# Altium footprint library 二极管封装库.PcbLib: 222 footprints (part 5 of 14)
Each footprint in its own frame and in the unit in brackets; x right, y up, seen from the top. Pads: shape width x height; smd on the part's side, far side on the other; paste and mask are expansions set on the pad; w line width, h text height; cw(c..) or ccw(c..) is an arc to the next point about the centre after c.
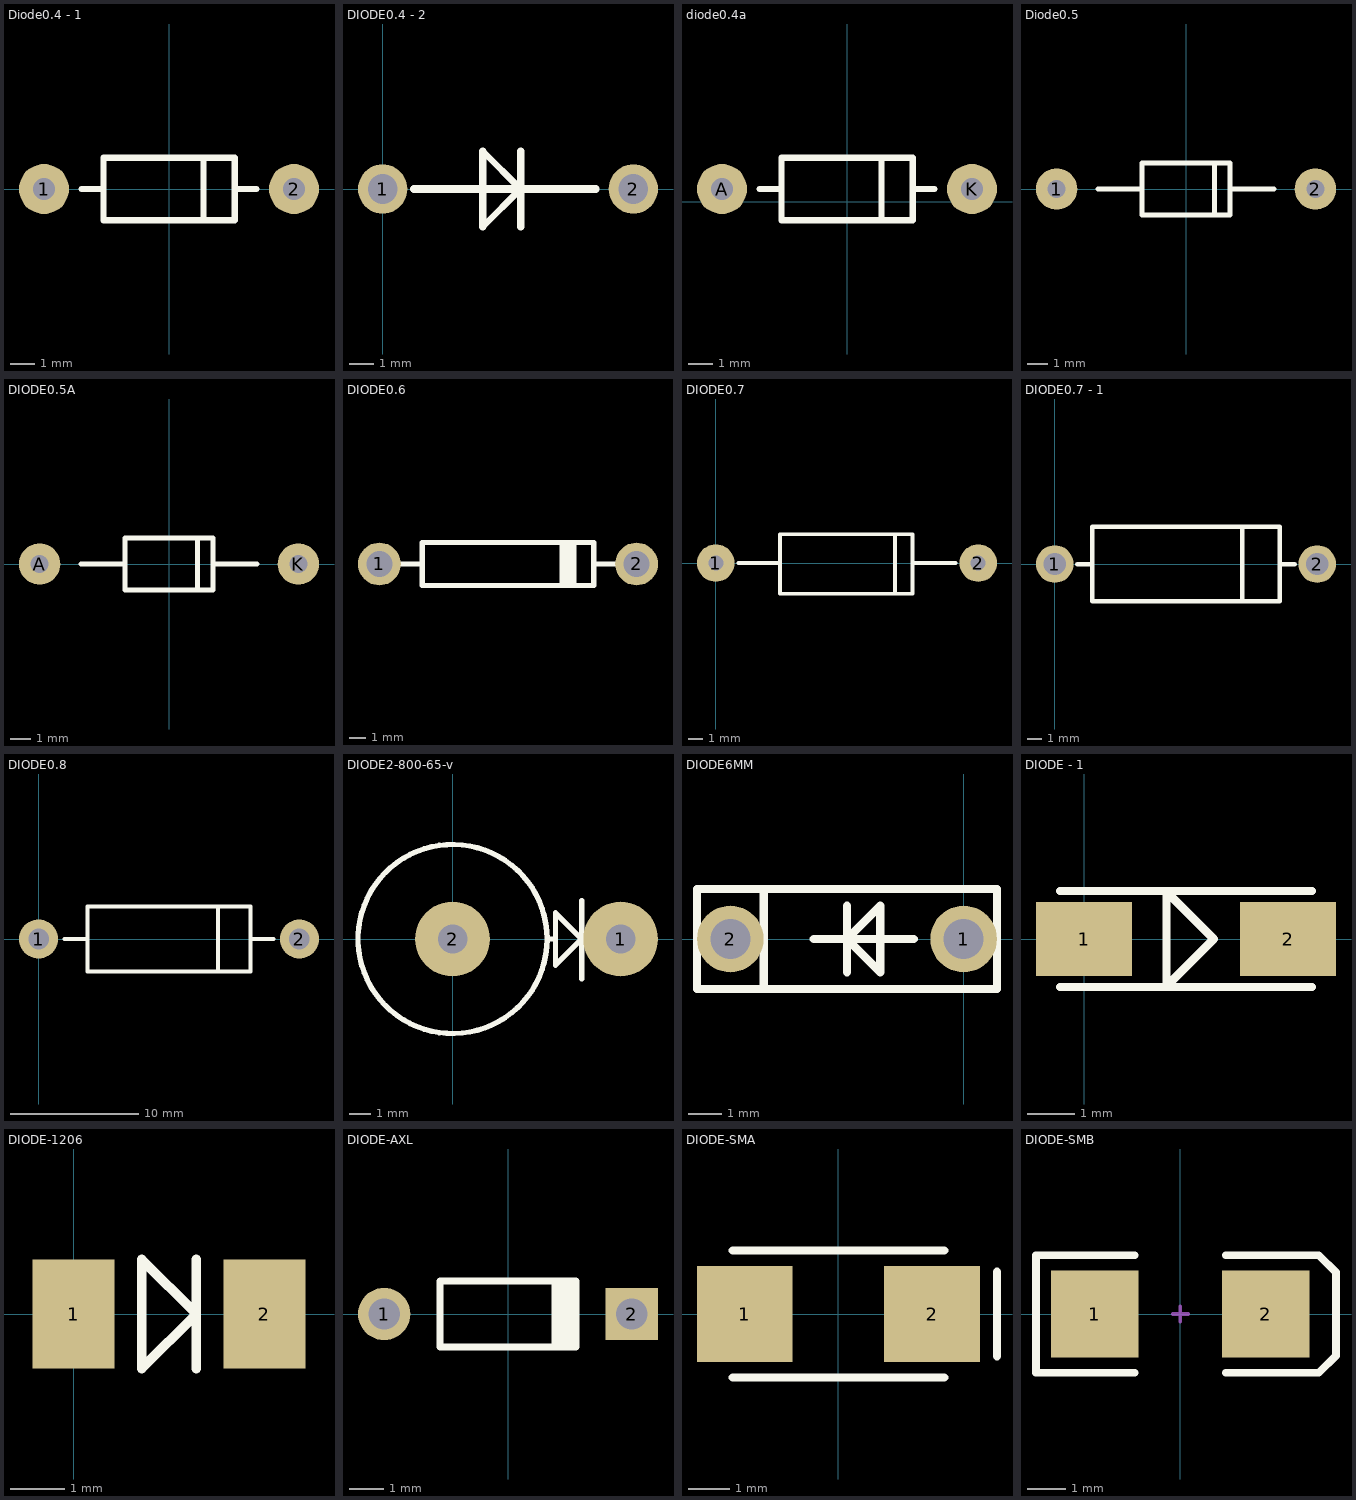
[diagram p4: the footprints below, top view; thin cyan lines are the x and y axes]

## Diode0.4 - 1 [mil]
pads (2):
  round 80 hole 35: 1(-200,0) 2(200,0)
Top Overlay:
  lines w10: -140,0 -105,0 ; 55,-50 55,50 ; 105,0 140,0 ; -105,-50 105,-50 105,50 -105,50 -105,-10 -105,-50

## DIODE0.4 - 2 [mm]
pads (2):
  round 2 hole 1.2: 1(0,0) 2(10.16,0)
Top Overlay:
  lines w0.254: 4.064,-1.524 5.588,0 4.064,1.524
  lines w0.305: 1.27,0 8.636,0 ; 4.064,-1.524 4.064,1.524 ; 5.588,-1.524 5.588,1.524

## diode0.4a [mil]
pads (2):
  round 80 hole 35: A(-200,20) K(200,20)
Top Overlay:
  lines w10: -140,20 -105,20 ; 55,-30 55,70 ; 105,20 140,20 ; -105,-30 105,-30 105,70 -105,70 -105,10 -105,-30

## Diode0.5 [mil]
pads (2):
  round 80 hole 35: 1(-250,0) 2(250,0)
Top Overlay:
  lines w10: -170,0 -85,0 ; 55,-50 55,50 ; 85,0 170,0 ; -85,0 -85,-50 85,-50 85,50 -85,50 -85,0

## DIODE0.5A [mil]
pads (2):
  round 80 hole 35: A(-250,0) K(250,0)
Top Overlay:
  lines w10: -170,0 -85,0 ; 55,-50 55,50 ; 85,0 170,0 ; -85,0 -85,50 85,50 85,-50 -85,-50 -85,0

## DIODE0.6 [mil]
pads (2):
  round 100 hole 60: 1(11000,-2000) 2(11600,-2000)
Top Overlay:
  rectangle: 11420,-2050 11460,-1950
  lines w12: 11040,-2000 11100,-2000 ; 11500,-2000 11560,-2000 ; 11100,-2050 11100,-1950 11500,-1950 11500,-2050 11100,-2050

## DIODE0.7 [mil]
pads (2):
  round 100 hole 40: 1(0,0) 2(700,0)
Top Overlay:
  lines w10: 60,0 170,0 ; 478,-82 478,77 ; 528,0 640,0 ; 171,-82 525,-82 525,77 171,77 171,-82
3D body "User Library-1N5353B.step": height 151.18, standoff -118.11, extent -17.85,-74.88 721.85,70

## DIODE0.7 - 1 [mm]
pads (2):
  round 2.54 hole 1.5: 1(0,0) 2(17.78,0)
Top Overlay:
  lines w0.305: 1.524,0 2.54,0 ; 12.7,-2.54 12.7,2.54 ; 15.24,0 16.256,0 ; 2.54,-2.54 15.24,-2.54 15.24,2.54 2.54,2.54 2.54,-2.54

## DIODE0.8 [mil]
pads (2):
  round 120 hole 62.99: 1(0,0) 2(800,0)
Top Overlay:
  lines w12: 80,0 150,0 ; 550,-100 550,100 ; 650,0 720,0 ; 150,-100 650,-100 650,100 150,100 150,-100

## DIODE2-800-65-v [mil]
pads (2):
  round 140 hole 55.12: 1(314.96,0) 2(0,0)
Top Overlay:
  circle w10: c0,0 r177.17
  lines w10: 177.17,0 193,0 ; 242,-75 242,72 ; 193,-49 242,0 193,49 193,-49

## DIODE6MM [mm]
pads (2):
  round 2 hole 1.2: 1(0,0) 2(-7,0)
Top Overlay:
  lines w0.254: -6,-1.5 -6,1.5 ; -4.5,0 -1.5,0 ; -3.5,-1 -3.5,1 ; -8,-1.5 -8,1.5 1,1.5 1,-1.5 -8,-1.5 ; -3.5,0 -2.5,-1 -2.5,1 -3.5,0

## DIODE - 1 [mil]
pads (2):
  rect 80x62 smd: 1(0,0) 2(170,0)
Top Overlay:
  lines w7: -20,-40 190,-40 ; -20,40 190,40 ; 68.74,-39.37 108.11,0 68.74,39.37 68.74,-39.37

## DIODE-1206 [mm] "玻璃封装二极管"
height 3
pads (2):
  rect 1.5x2 smd: 1(0,0) 2(3.5,0)
Top Overlay:
  lines w0.178: 2.25,-1 2.25,1 ; 1.25,-1 2.25,0 1.25,1 1.25,-1

## DIODE-AXL [mm] "直插二极管"
height 1.9
pads (2):
  round 1.5 hole 0.9: 1(-3.55,0)
  rect 1.5x1.5 hole 0.9: 2(3.55,0)
Top Overlay:
  rectangle: 1.25,-0.95 2.05,0.95
  lines w0.2: 1.95,-0.95 -1.95,-0.95 -1.95,0.95 1.95,0.95

## DIODE-SMA [mm] "贴片二极管"
height 2.54
pads (2):
  rect 2.3x2.3 smd: 1(-2.25,0) 2(2.25,0)
Top Overlay:
  lines w0.2: -2.54,-1.524 2.54,-1.524 ; -2.54,1.524 2.54,1.524 ; 3.81,-1.016 3.81,1.016
3D body: height 3, standoff 0, extent -2.921,-1.397 2.921,1.397

## DIODE-SMB [mm] "DO-214-AA/SMB; 2 C-Bend Leads; Body 5.3 x 3.6 mm, inc. leads (LxW)"
height 2.54
pads (2):
  rect 2.3x2.3 smd: 1(-2.25,0) 2(2.25,0)
Top Overlay:
  lines w0.2: -1.2,-1.55 -3.8,-1.55 -3.8,1.55 -1.2,1.55 ; 1.2,-1.55 3.65,-1.55 4.1,-1.1 4.1,1.1 3.65,1.55 1.2,1.55
Mechanical 1:
  lines w0.1: -0.2,0 0.2,0 ; 0,-0.2 0,0.2